# Altium footprint library Electronic Devices_LIB.PcbLib: 410 footprints (part 9 of 26)
Each footprint in its own frame and in the unit in brackets; x right, y up, seen from the top. Pads: shape width x height; smd on the part's side, far side on the other; paste and mask are expansions set on the pad; w line width, h text height; cw(c..) or ccw(c..) is an arc to the next point about the centre after c.
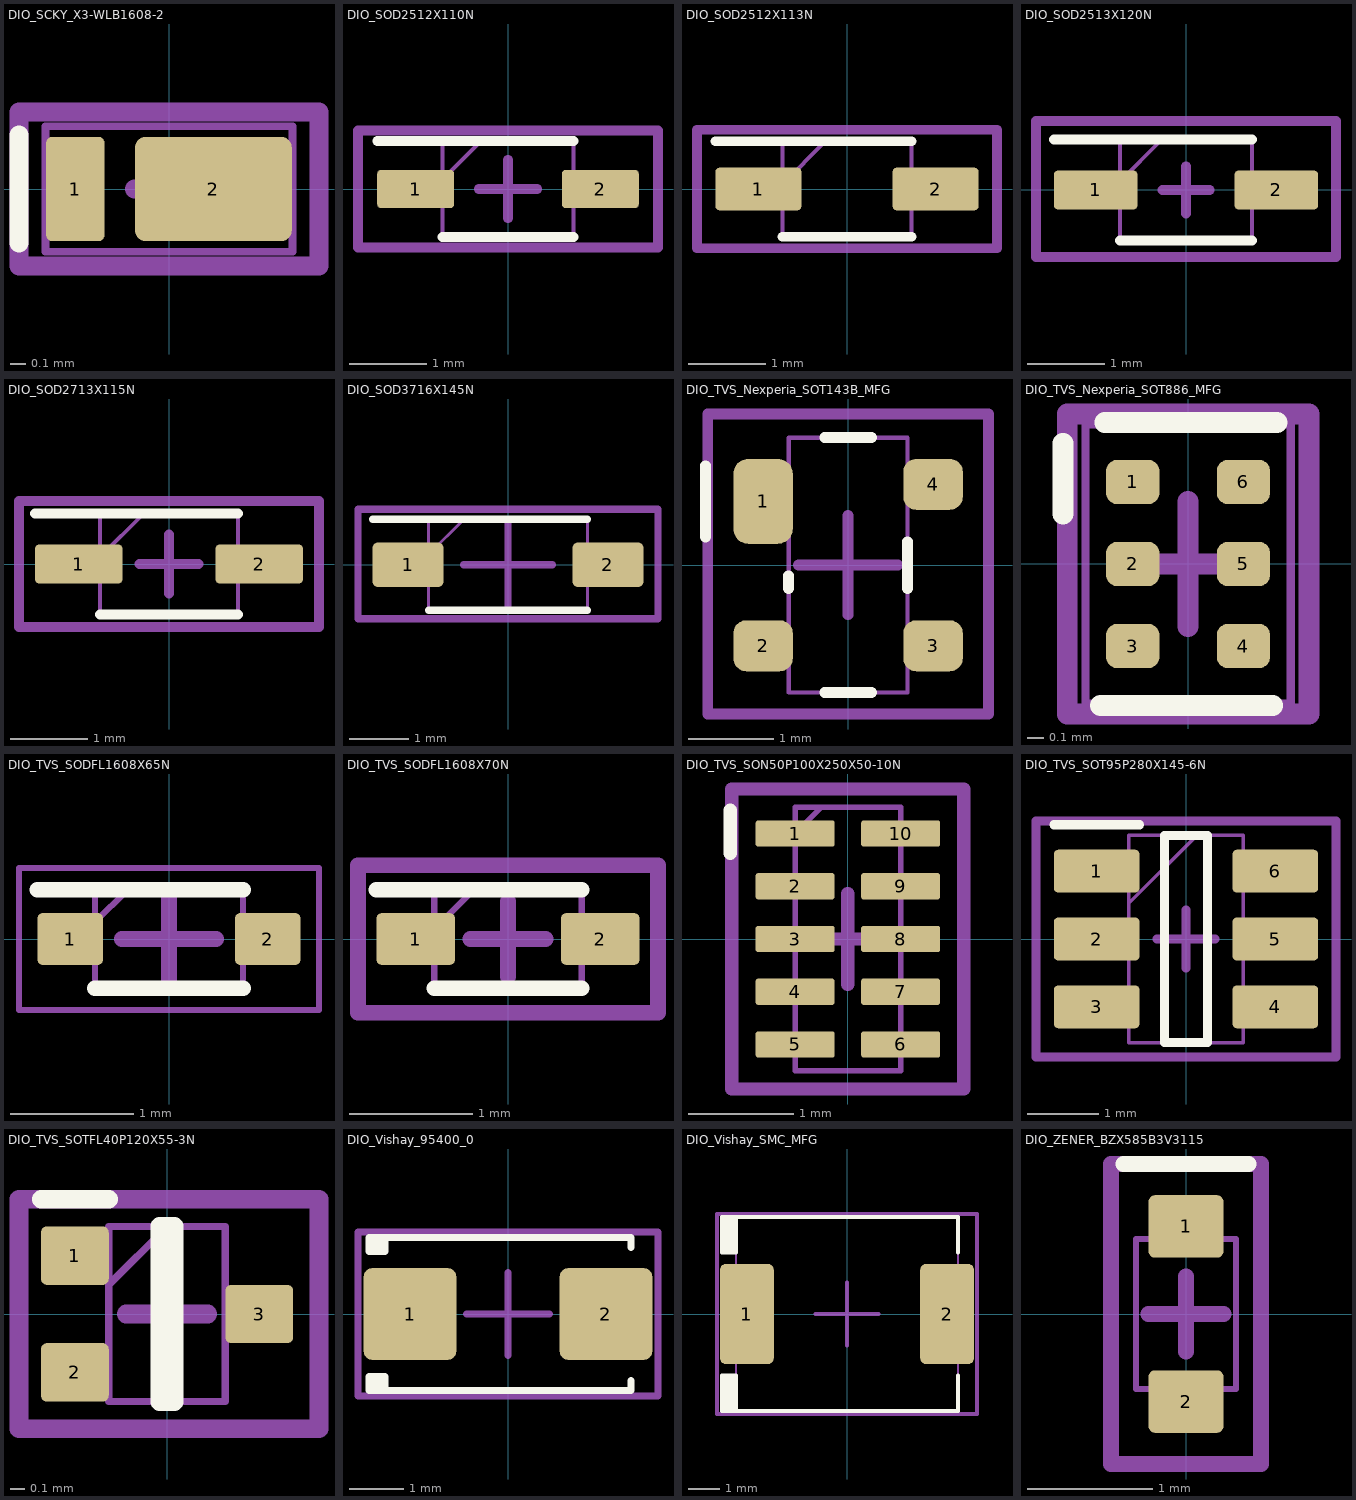
[diagram p8: the footprints below, top view; thin cyan lines are the x and y axes]

## DIO_SCKY_X3-WLB1608-2 [mm] "X3-WLB1608-2"
height 0.3
pads (2):
  rrect20% 0.385x0.69 smd mask+0.076: 1(-0.619,0)
  rrect20% 1.035x0.69 smd mask+0.076: 2(0.293,0)
Top Overlay:
  lines w0.127: -0.991,-0.356 -0.991,0.356
Top Assembly:
  lines w0.051: -0.815,-0.415 -0.815,0.415 0.815,0.415 0.815,-0.415 -0.815,-0.415
  text ".Designator" at -2.591,-0.11 h0.51
Top Courtyard:
  lines w0.127: -0.229,0 0,0 ; 0,-0.229 0,0 ; 0,0.229 0,0 ; 0.229,0 0,0 ; -0.991,-0.508 -0.991,0.508 0.991,0.508 0.991,-0.508 -0.991,-0.508
3D body "DIODE_SDM2U30CSP-7_DIO.step": height 0.26, standoff 0, extent -0.8,-0.406 0.8,0.406

## DIO_SOD2512X110N [mm] "SC-76, SOD-323"
height 1
pads (2):
  rrect20% 1x0.5 smd: 1(-1.2,0) 2(1.2,0)
Top Overlay:
  lines w0.127: -1.7,0.625 0.85,0.625 ; -0.85,-0.625 0.85,-0.625
Top Assembly:
  lines w0.051: -0.85,0.125 -0.35,0.625 ; -0.85,-0.625 -0.85,0.625 0.85,0.625 0.85,-0.625 -0.85,-0.625
  text ".Designator" at -2.616,-0.186 h0.51
Top Courtyard:
  lines w0.127: -0.381,0 0,0 ; 0,-0.381 0,0 ; 0,0.381 0,0 ; 0.381,0 0,0 ; -1.95,-0.762 -1.95,0.762 1.95,0.762 1.95,-0.762 -1.95,-0.762
3D body "MM3Z8V2ST1G.stp": height 1.1, standoff 0, extent -1.25,-0.625 1.25,0.625

## DIO_SOD2512X113N [mm] "SOD-323"
height 1.13
pads (2):
  rrect20% 1.11x0.55 smd: 1(-1.14,0) 2(1.14,0)
Top Overlay:
  lines w0.127: -1.695,0.615 0.83,0.615 ; -0.83,-0.615 0.83,-0.615
Top Assembly:
  lines w0.051: -0.83,0.06 -0.275,0.615 ; -0.83,-0.615 -0.83,0.615 0.83,0.615 0.83,-0.615 -0.83,-0.615
  text ".Designator" at -2.591,-0.186 h0.51
Top Courtyard:
  lines w0.127: -1.93,-0.762 -1.93,0.762 1.93,0.762 1.93,-0.762 -1.93,-0.762
3D body "BAT20JFILM.stp": height 1.13, standoff 0, extent -1.25,-0.615 1.25,0.615

## DIO_SOD2513X120N [mm] "SOD-323"
height 1.1
pads (2):
  rrect20% 1.075x0.5 smd: 1(-1.162,0) 2(1.162,0)
Top Overlay:
  lines w0.127: -1.7,0.65 0.85,0.65 ; -0.85,-0.65 0.85,-0.65
Top Assembly:
  text ".Designator" at -2.667,-0.186 h0.51
Top Courtyard:
  lines w0.127: -0.305,0 0,0 ; 0,-0.305 0,0 ; 0,0.305 0,0 ; 0.305,0 0,0 ; -1.93,-0.864 1.93,-0.864 1.93,0.889 -1.93,0.889 -1.93,-0.864
Top 3D Body:
  lines w0.051: -0.85,0.112 -0.312,0.65 ; -0.85,-0.65 0.85,-0.65 0.85,0.65 -0.85,0.65 -0.85,-0.65
3D body "ZLLS400TA.stp": height 1.2, standoff 0, extent -1.25,-0.65 1.25,0.65

## DIO_SOD2713X115N [mm] "SOD-323"
height 1.15
pads (2):
  rrect20% 1.125x0.5 smd: 1(-1.162,0) 2(1.162,0)
Top Overlay:
  lines w0.127: -1.725,0.65 0.888,0.65 ; -0.888,-0.65 0.888,-0.65
Top Assembly:
  lines w0.051: -0.888,0.088 -0.325,0.65 ; -0.888,-0.65 -0.888,0.65 0.888,0.65 0.888,-0.65 -0.888,-0.65
  text ".Designator" at -2.692,-0.11 h0.51
Top Courtyard:
  lines w0.127: -0.381,0 0,0 ; 0,-0.381 0,0 ; 0,0.381 0,0 ; 0.381,0 0,0 ; -1.93,-0.813 -1.93,0.813 1.93,0.813 1.93,-0.813 -1.93,-0.813
3D body "1N4148WS-E3-18.stp": height 1.15, standoff 0, extent -1.338,-0.65 1.338,0.65

## DIO_SOD3716X145N [mm]
pads (2):
  rrect20% 1.2x0.75 smd: 1(-1.7,0) 2(1.7,0)
Top Overlay:
  lines w0.127: -2.3,0.775 1.35,0.775 ; -1.35,-0.775 1.35,-0.775
Top Assembly:
  lines w0.051: -1.35,0.175 -0.75,0.775 ; -1.35,-0.775 1.35,-0.775 1.35,0.775 -1.35,0.775 -1.35,-0.775
  text ".Designator" at -2.489,-0.212 h0.51
Top Courtyard:
  lines w0.127: -0.75,0 0,0 ; 0,-0.75 0,0 ; 0,0.75 0,0 ; 0.75,0 0,0 ; -2.55,-0.914 2.55,-0.914 2.55,0.94 -2.55,0.94 -2.55,-0.914
3D body "1N5819HW-7-F.stp": height 1.45, standoff 0, extent -1.85,-0.775 1.85,0.775

## DIO_TVS_Nexperia_SOT143B_MFG [mm] "SOT143B"
pads (4):
  rrect50% 0.7x1 smd: 1(-1,0.75)
  rrect50% 0.7x0.6 smd: 2(-1,-0.95) 3(1,-0.95) 4(1,0.95)
Top Overlay:
  lines w0.127: -1.676,0.33 -1.676,1.168 ; -0.7,-0.275 -0.7,-0.125 ; -0.275,-1.5 0.275,-1.5 ; -0.275,1.5 0.275,1.5 ; 0.7,-0.275 0.7,0.275
Top Paste:
  rectangle: -1.3,0.3 -0.7,1.2
  rectangle: -1.3,-1.2 -0.7,-0.7
  rectangle: 0.7,-1.2 1.3,-0.7
  rectangle: 0.7,0.7 1.3,1.2
Top Assembly:
  lines w0.051: -0.7,-1.5 0.7,-1.5 0.7,1.5 -0.7,1.5 -0.7,-1.5
  text ".Designator" at -2.311,-0.059 h0.51
Top Courtyard:
  lines w0.127: -0.584,0 0,0 ; 0,-0.584 0,0 ; 0,0.584 0,0 ; 0.584,0 0,0 ; -1.651,-1.753 1.651,-1.753 1.651,1.778 -1.651,1.778 -1.651,-1.753
3D body "Diode_Nexperia_PRTR5V0U2X_215_eec.STEP": height 0.25, standoff 0, extent -1.5,-1.625 1.5,1.625

## DIO_TVS_Nexperia_SOT886_MFG [mm] "6-XFDFN"
pads (6):
  rrect50% 0.325x0.27 smd paste+0: 1(-0.337,0.5) 2(-0.337,0) 3(-0.337,-0.5) 4(0.337,-0.5) 5(0.337,0) 6(0.337,0.5)
Top Overlay:
  lines w0.127: -0.762,0.305 -0.762,0.737 ; -0.533,-0.864 0.517,-0.864 ; -0.508,0.864 0.542,0.864
Top Assembly:
  lines w0.051: -0.625,-0.85 0.625,-0.85 0.625,0.85 -0.625,0.85 -0.625,-0.85
  text ".Designator" at -2.565,-0.186 h0.51
Top Courtyard:
  lines w0.127: -0.381,0 0,0 ; 0,-0.381 0,0 ; 0,0.381 0,0 ; 0.381,0 0,0 ; -0.737,-0.914 0.737,-0.914 0.737,0.914 -0.737,0.914 -0.737,-0.914
3D body "Diode_Nexperia_PRTR5V0U2F,115_eec.STEP": height 0.25, standoff 0, extent -0.625,-0.85 0.625,0.85

## DIO_TVS_SODFL1608X65N [mm]
pads (2):
  rrect20% 0.53x0.42 smd: 1(-0.8,0) 2(0.8,0)
Top Overlay:
  lines w0.127: -1.065,0.4 0.6,0.4 ; -0.6,-0.4 0.6,-0.4
Top Assembly:
  lines w0.051: -0.6,0.135 -0.335,0.4 ; -0.6,-0.4 -0.6,0.4 0.6,0.4 0.6,-0.4 -0.6,-0.4
  text ".Designator" at -2.515,-0.085 h0.51
Top Courtyard:
  lines w0.127: -0.381,0 0,0 ; 0,-0.381 0,0 ; 0,0.381 0,0 ; 0.381,0 0,0
Mechanical 15:
  lines w0.05: -1.215,-0.575 -1.215,0.575 1.215,0.575 1.215,-0.575 -1.215,-0.575
3D body "PESD5V0S1BB,115.stp": height 0.61, standoff 0, extent -0.801,-0.415 0.799,0.415

## DIO_TVS_SODFL1608X70N [mm] "SC-79, SOD-523"
height 0.7
pads (2):
  rrect20% 0.64x0.42 smd: 1(-0.75,0) 2(0.75,0)
Top Overlay:
  lines w0.127: -1.07,0.4 0.6,0.4 ; -0.6,-0.4 0.6,-0.4
Top Assembly:
  lines w0.051: -0.6,0.08 -0.28,0.4 ; -0.6,-0.4 -0.6,0.4 0.6,0.4 0.6,-0.4 -0.6,-0.4
  text ".Designator" at -2.642,-0.212 h0.51
Top Courtyard:
  lines w0.127: -0.305,0 0,0 ; 0,-0.305 0,0 ; 0,0.305 0,0 ; 0.305,0 0,0 ; -1.22,-0.6 -1.22,0.6 1.22,0.6 1.22,-0.6 -1.22,-0.6
3D body "ESD5B5.0ST1G.stp": height 0.7, standoff 0, extent -0.8,-0.4 0.8,0.4

## DIO_TVS_SON50P100X250X50-10N [mm] "10-XFDFN"
height 0.5
pads (10):
  rrect20% 0.75x0.25 smd: 1(-0.5,1) 2(-0.5,0.5) 3(-0.5,0) 4(-0.5,-0.5) 5(-0.5,-1) 6(0.5,-1) 7(0.5,-0.5) 8(0.5,0) 9(0.5,0.5) 10(0.5,1)
Top Overlay:
  lines w0.127: -1.118,0.813 -1.118,1.219
Top Assembly:
  lines w0.051: -0.5,1 -0.25,1.25 ; -0.5,-1.25 -0.5,1.25 0.5,1.25 0.5,-1.25 -0.5,-1.25
  text ".Designator" at -2.515,-0.237 h0.51
Top Courtyard:
  lines w0.127: -0.432,0 0,0 ; 0,-0.432 0,0 ; 0,0.432 0,0 ; 0.432,0 0,0 ; -1.1,-1.422 -1.1,1.422 1.1,1.422 1.1,-1.422 -1.1,-1.422
3D body "IP4292CZ10-TBR,115.stp": height 0.5, standoff 0, extent -0.55,-1.25 0.55,1.25

## DIO_TVS_SOT95P280X145-6N [mm] "SOT-23-6"
height 1.45
pads (6):
  rrect20% 1.2x0.6 smd: 1(-1.25,0.95) 2(-1.25,0) 3(-1.25,-0.95) 4(1.25,-0.95) 5(1.25,0) 6(1.25,0.95)
Top Overlay:
  lines w0.127: -1.85,1.6 -0.65,1.6 ; -0.3,-1.45 0.3,-1.45 0.3,1.45 -0.3,1.45 -0.3,-1.45
Top Assembly:
  lines w0.051: -0.8,0.5 0.15,1.45 ; -0.8,-1.45 -0.8,1.45 0.8,1.45 0.8,-1.45 -0.8,-1.45
  text ".Designator" at -2.591,-0.034 h0.51
Top Courtyard:
  lines w0.127: -0.406,0 0,0 ; 0,-0.406 0,0 ; 0,0.406 0,0 ; 0.406,0 0,0 ; -2.1,-1.651 2.1,-1.651 2.1,1.651 -2.1,1.651 -2.1,-1.651
3D body "TLV9101SIDBVR.stp": height 1.2, standoff 0, extent -1.4,-1.45 1.4,1.45

## DIO_TVS_SOTFL40P120X55-3N [mm] "SOT-723"
height 0.55
pads (3):
  rrect20% 0.465x0.4 smd: 1(-0.632,0.4) 2(-0.632,-0.4) 3(0.632,0)
Top Overlay:
  lines w0.127: -0.864,0.787 -0.399,0.787 ; -0.05,-0.6 -0.05,0.6 0.05,0.6 0.05,-0.6 -0.05,-0.6
Top Assembly:
  lines w0.051: -0.4,0.2 0,0.6 ; -0.4,-0.6 -0.4,0.6 0.4,0.6 0.4,-0.6 -0.4,-0.6
  text ".Designator" at -2.413,-0.11 h0.51
Top Courtyard:
  lines w0.127: -0.279,0 0,0 ; 0,-0.279 0,0 ; 0,0.279 0,0 ; 0.279,0 0,0 ; -1.015,-0.787 -1.015,0.787 1.041,0.787 1.041,-0.787 -1.015,-0.787
3D body "ESD7C3.3DT5G.stp": height 0.55, standoff 0, extent -0.6,-0.6 0.6,0.6

## DIO_Vishay_95400_0 [mm] "DO-214AC (SMA)"
height 2.29
pads (2):
  rrect20% 1.7x1.68 smd paste+0: 1(-1.79,0) 2(1.79,0)
Top Overlay:
  rectangle: -2.538,-1.395 -2.25,-1.143
  rectangle: -2.538,1.143 -2.25,1.395
  lines w0.127: 2.25,-1.215 2.25,-1.395 -2.25,-1.395 ; 2.25,1.215 2.25,1.395 -2.25,1.395 ; -2.25,-1.395 -2.538,-1.395 -2.538,-1.143 -2.25,-1.143 ; -2.25,-1.395 -2.25,-1.143 ; -2.25,-1.395 -2.25,-1.143 ; -2.25,1.395 -2.538,1.395 -2.538,1.143 -2.25,1.143 -2.25,1.395
Top Assembly:
  lines w0.051: -2.74,-1.495 -2.74,1.495 2.74,1.495 2.74,-1.495 -2.74,-1.495
  text ".Designator" at -2.362,-0.288 h0.51
Top Courtyard:
  lines w0.127: -0.762,0 0,0 ; 0,-0.762 0,0 ; 0,0.762 0,0 ; 0.762,0 0,0 ; -2.74,-1.495 -2.74,1.495 2.74,1.495 2.74,-1.495 -2.74,-1.495
3D body "Diode_Vishay_S1A-E3-61T_eec.STEP": height 0.25, standoff 0, extent -2.74,-1.495 2.74,1.495

## DIO_Vishay_SMC_MFG [mm] "DO-214AB (SMA)"
height 2.62
pads (2):
  rrect20% 1.72x3.2 smd paste+0: 1(-3.205,0) 2(3.205,0)
Top Overlay:
  rectangle: -4.002,-3.11 -3.555,-1.975
  rectangle: -4.002,1.975 -3.555,3.11
  lines w0.127: 3.555,-1.975 3.555,-3.11 -3.555,-3.11 ; 3.555,1.975 3.555,3.11 -3.555,3.11 ; -3.555,-3.11 -4.002,-3.11 -4.002,-1.975 -3.555,-1.975 -3.555,-3.11 ; -3.555,3.11 -4.002,3.11 -4.002,1.975 -3.555,1.975 -3.555,3.11
Top Assembly:
  lines w0.051: -3.555,-3.11 -3.555,3.11 3.555,3.11 3.555,-3.11 -3.555,-3.11
  text ".Designator" at -2.616,-0.288 h0.51
Top Courtyard:
  lines w0.127: -1.016,0 0,0 ; 0,-1.016 0,0 ; 0,1.016 0,0 ; 1.016,0 0,0 ; -4.165,-3.21 -4.165,3.21 4.165,3.21 4.165,-3.21 -4.165,-3.21
3D body "Diode_Vishay_SS34-E3-9AT_eec.STEP": height 0.25, standoff 0, extent -4.165,-3.21 4.165,3.21

## DIO_ZENER_BZX585B3V3115 [mm] "SC-79, SOD-523"
height 0.65
pads (2):
  rrect20% 0.6x0.5 smd: 1(0,0.7) 2(0,-0.7)
Top Overlay:
  lines w0.127: -0.5,1.2 0.5,1.2
Top Assembly:
  lines w0.051: -0.4,-0.6 0.4,-0.6 0.4,0.6 -0.4,0.6 -0.4,-0.6
  text ".Designator" at -2.349,-0.08 h0.51
Top Courtyard:
  lines w0.127: -0.3,0 0,0 ; 0,-0.3 0,0 ; 0,0.3 0,0 ; 0.3,0 0,0 ; -0.6,-1.2 0.6,-1.2 0.6,1.2 -0.6,1.2 -0.6,-1.2
3D body "BZX585-B3V3,115.stp": height 0.61, standoff 0, extent -0.415,-0.799 0.415,0.801